# Altium footprint library TI - ADC.PcbLib: 214 footprints (part 7 of 14)
Each footprint in its own frame and in the unit in brackets; x right, y up, seen from the top. Pads: shape width x height; smd on the part's side, far side on the other; paste and mask are expansions set on the pad; w line width, h text height; cw(c..) or ccw(c..) is an arc to the next point about the centre after c.
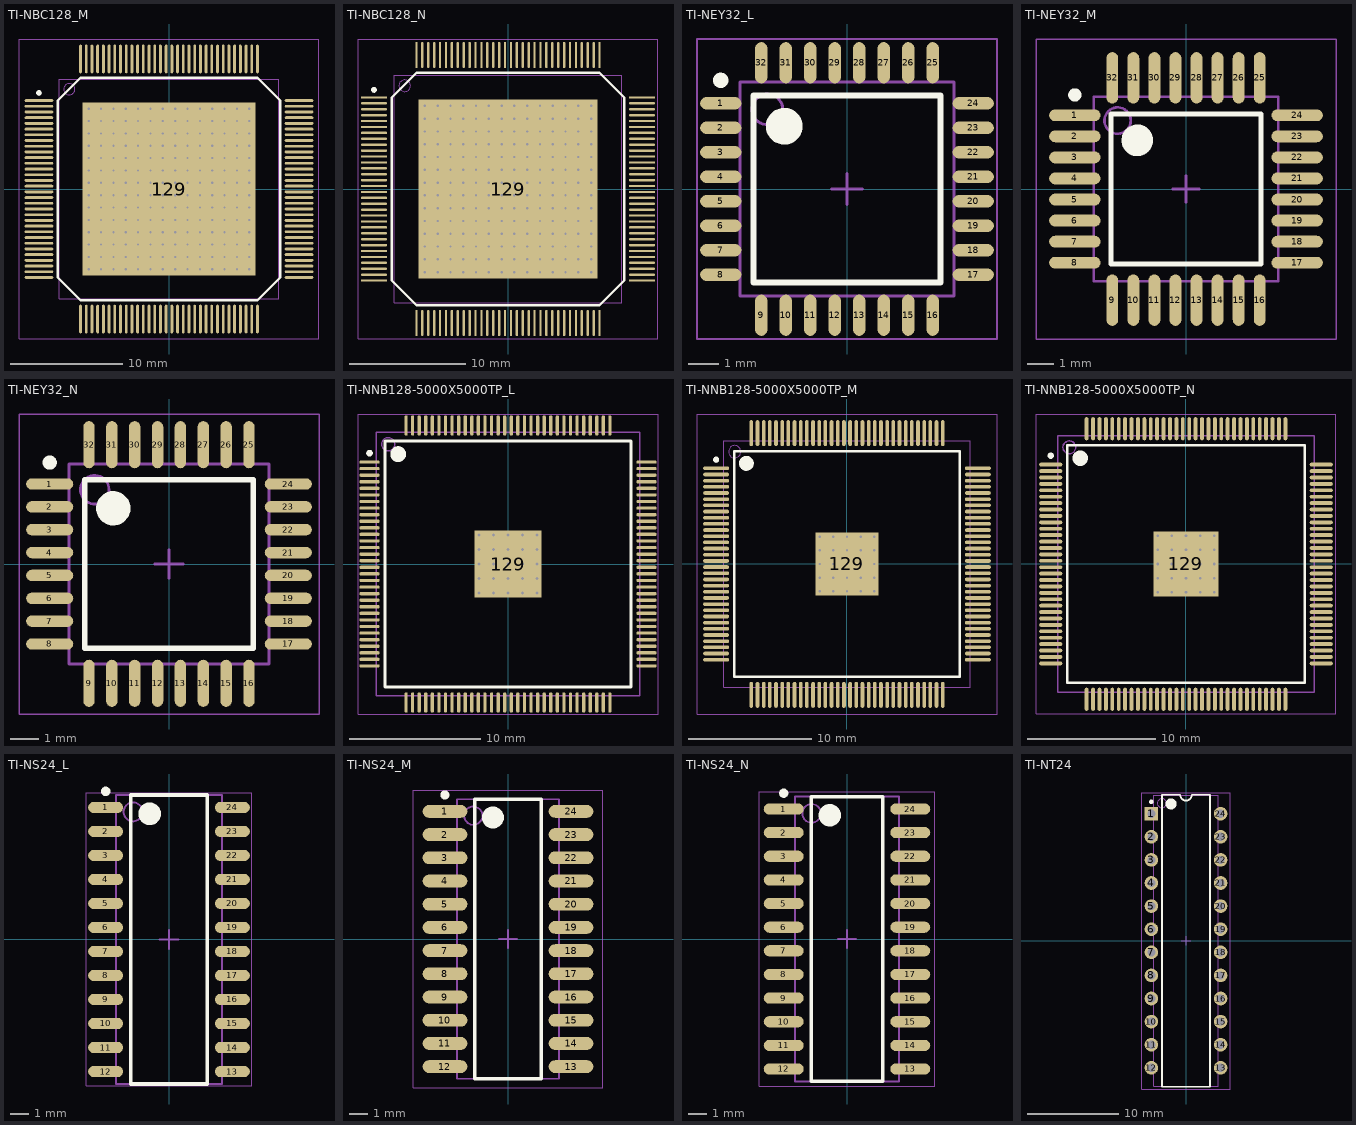
[diagram p6: the footprints below, top view; thin cyan lines are the x and y axes]

## TI-NBC128_M [mm] "CQFP, 128-Leads, Body 19.558x19.558mm, Pitch 0.508mm, Thermal Pad 15.39 x 15.39 mm, IPC Low Density"
height 1.99
pads (129):
  oval 2.55x0.25 smd: 1(-11.575,7.874) 2(-11.575,7.366) 3(-11.575,6.858) 4(-11.575,6.35) 5(-11.575,5.842) 6(-11.575,5.334) 7(-11.575,4.826) 8(-11.575,4.318) 9(-11.575,3.81) 10(-11.575,3.302) 11(-11.575,2.794) 12(-11.575,2.286) 13(-11.575,1.778) 14(-11.575,1.27) 15(-11.575,0.762) 16(-11.575,0.254) 17(-11.575,-0.254) 18(-11.575,-0.762) 19(-11.575,-1.27) 20(-11.575,-1.778) 21(-11.575,-2.286) 22(-11.575,-2.794) 23(-11.575,-3.302) 24(-11.575,-3.81) 25(-11.575,-4.318) 26(-11.575,-4.826) 27(-11.575,-5.334) 28(-11.575,-5.842) 29(-11.575,-6.35) 30(-11.575,-6.858) 31(-11.575,-7.366) 32(-11.575,-7.874) 65(11.575,-7.874) 66(11.575,-7.366) 67(11.575,-6.858) 68(11.575,-6.35) 69(11.575,-5.842) 70(11.575,-5.334) 71(11.575,-4.826) 72(11.575,-4.318) 73(11.575,-3.81) 74(11.575,-3.302) 75(11.575,-2.794) 76(11.575,-2.286) 77(11.575,-1.778) 78(11.575,-1.27) 79(11.575,-0.762) 80(11.575,-0.254) 81(11.575,0.254) 82(11.575,0.762) 83(11.575,1.27) 84(11.575,1.778) 85(11.575,2.286) 86(11.575,2.794) 87(11.575,3.302) 88(11.575,3.81) 89(11.575,4.318) 90(11.575,4.826) 91(11.575,5.334) 92(11.575,5.842) 93(11.575,6.35) 94(11.575,6.858) 95(11.575,7.366) 96(11.575,7.874)
  oval 0.25x2.55 smd: 33(-7.874,-11.575) 34(-7.366,-11.575) 35(-6.858,-11.575) 36(-6.35,-11.575) 37(-5.842,-11.575) 38(-5.334,-11.575) 39(-4.826,-11.575) 40(-4.318,-11.575) 41(-3.81,-11.575) 42(-3.302,-11.575) 43(-2.794,-11.575) 44(-2.286,-11.575) 45(-1.778,-11.575) 46(-1.27,-11.575) 47(-0.762,-11.575) 48(-0.254,-11.575) 49(0.254,-11.575) 50(0.762,-11.575) 51(1.27,-11.575) 52(1.778,-11.575) 53(2.286,-11.575) 54(2.794,-11.575) 55(3.302,-11.575) 56(3.81,-11.575) 57(4.318,-11.575) 58(4.826,-11.575) 59(5.334,-11.575) 60(5.842,-11.575) 61(6.35,-11.575) 62(6.858,-11.575) 63(7.366,-11.575) 64(7.874,-11.575) 97(7.874,11.575) 98(7.366,11.575) 99(6.858,11.575) 100(6.35,11.575) 101(5.842,11.575) 102(5.334,11.575) 103(4.826,11.575) 104(4.318,11.575) 105(3.81,11.575) 106(3.302,11.575) 107(2.794,11.575) 108(2.286,11.575) 109(1.778,11.575) 110(1.27,11.575) 111(0.762,11.575) 112(0.254,11.575) 113(-0.254,11.575) 114(-0.762,11.575) 115(-1.27,11.575) 116(-1.778,11.575) 117(-2.286,11.575) 118(-2.794,11.575) 119(-3.302,11.575) 120(-3.81,11.575) 121(-4.318,11.575) 122(-4.826,11.575) 123(-5.334,11.575) 124(-5.842,11.575) 125(-6.35,11.575) 126(-6.858,11.575) 127(-7.366,11.575) 128(-7.874,11.575)
  rect 15.39x15.39 smd: 129(0,0)
via -7.15,7.15 diameter 0.5 hole 0.2
via -6.05,7.15 diameter 0.5 hole 0.2
via -4.95,7.15 diameter 0.5 hole 0.2
via -3.85,7.15 diameter 0.5 hole 0.2
via -2.75,7.15 diameter 0.5 hole 0.2
via -1.65,7.15 diameter 0.5 hole 0.2
via -0.55,7.15 diameter 0.5 hole 0.2
via 0.55,7.15 diameter 0.5 hole 0.2
via 1.65,7.15 diameter 0.5 hole 0.2
via 2.75,7.15 diameter 0.5 hole 0.2
via 3.85,7.15 diameter 0.5 hole 0.2
via 4.95,7.15 diameter 0.5 hole 0.2
via 6.05,7.15 diameter 0.5 hole 0.2
via 7.15,7.15 diameter 0.5 hole 0.2
via -7.15,6.05 diameter 0.5 hole 0.2
via -6.05,6.05 diameter 0.5 hole 0.2
via -4.95,6.05 diameter 0.5 hole 0.2
via -3.85,6.05 diameter 0.5 hole 0.2
via -2.75,6.05 diameter 0.5 hole 0.2
via -1.65,6.05 diameter 0.5 hole 0.2
via -0.55,6.05 diameter 0.5 hole 0.2
via 0.55,6.05 diameter 0.5 hole 0.2
via 1.65,6.05 diameter 0.5 hole 0.2
via 2.75,6.05 diameter 0.5 hole 0.2
via 3.85,6.05 diameter 0.5 hole 0.2
via 4.95,6.05 diameter 0.5 hole 0.2
via 6.05,6.05 diameter 0.5 hole 0.2
via 7.15,6.05 diameter 0.5 hole 0.2
via -7.15,4.95 diameter 0.5 hole 0.2
via -6.05,4.95 diameter 0.5 hole 0.2
via -4.95,4.95 diameter 0.5 hole 0.2
via -3.85,4.95 diameter 0.5 hole 0.2
via -2.75,4.95 diameter 0.5 hole 0.2
via -1.65,4.95 diameter 0.5 hole 0.2
via -0.55,4.95 diameter 0.5 hole 0.2
via 0.55,4.95 diameter 0.5 hole 0.2
via 1.65,4.95 diameter 0.5 hole 0.2
via 2.75,4.95 diameter 0.5 hole 0.2
via 3.85,4.95 diameter 0.5 hole 0.2
via 4.95,4.95 diameter 0.5 hole 0.2
via 6.05,4.95 diameter 0.5 hole 0.2
via 7.15,4.95 diameter 0.5 hole 0.2
via -7.15,3.85 diameter 0.5 hole 0.2
via -6.05,3.85 diameter 0.5 hole 0.2
via -4.95,3.85 diameter 0.5 hole 0.2
via -3.85,3.85 diameter 0.5 hole 0.2
via -2.75,3.85 diameter 0.5 hole 0.2
via -1.65,3.85 diameter 0.5 hole 0.2
via -0.55,3.85 diameter 0.5 hole 0.2
via 0.55,3.85 diameter 0.5 hole 0.2
via 1.65,3.85 diameter 0.5 hole 0.2
via 2.75,3.85 diameter 0.5 hole 0.2
via 3.85,3.85 diameter 0.5 hole 0.2
via 4.95,3.85 diameter 0.5 hole 0.2
via 6.05,3.85 diameter 0.5 hole 0.2
via 7.15,3.85 diameter 0.5 hole 0.2
via -7.15,2.75 diameter 0.5 hole 0.2
via -6.05,2.75 diameter 0.5 hole 0.2
via -4.95,2.75 diameter 0.5 hole 0.2
via -3.85,2.75 diameter 0.5 hole 0.2
via -2.75,2.75 diameter 0.5 hole 0.2
via -1.65,2.75 diameter 0.5 hole 0.2
via -0.55,2.75 diameter 0.5 hole 0.2
via 0.55,2.75 diameter 0.5 hole 0.2
via 1.65,2.75 diameter 0.5 hole 0.2
via 2.75,2.75 diameter 0.5 hole 0.2
via 3.85,2.75 diameter 0.5 hole 0.2
via 4.95,2.75 diameter 0.5 hole 0.2
via 6.05,2.75 diameter 0.5 hole 0.2
via 7.15,2.75 diameter 0.5 hole 0.2
via -7.15,1.65 diameter 0.5 hole 0.2
via -6.05,1.65 diameter 0.5 hole 0.2
via -4.95,1.65 diameter 0.5 hole 0.2
via -3.85,1.65 diameter 0.5 hole 0.2
via -2.75,1.65 diameter 0.5 hole 0.2
via -1.65,1.65 diameter 0.5 hole 0.2
via -0.55,1.65 diameter 0.5 hole 0.2
via 0.55,1.65 diameter 0.5 hole 0.2
via 1.65,1.65 diameter 0.5 hole 0.2
via 2.75,1.65 diameter 0.5 hole 0.2
via 3.85,1.65 diameter 0.5 hole 0.2
via 4.95,1.65 diameter 0.5 hole 0.2
via 6.05,1.65 diameter 0.5 hole 0.2
via 7.15,1.65 diameter 0.5 hole 0.2
via -7.15,0.55 diameter 0.5 hole 0.2
via -6.05,0.55 diameter 0.5 hole 0.2
via -4.95,0.55 diameter 0.5 hole 0.2
via -3.85,0.55 diameter 0.5 hole 0.2
via -2.75,0.55 diameter 0.5 hole 0.2
via -1.65,0.55 diameter 0.5 hole 0.2
via -0.55,0.55 diameter 0.5 hole 0.2
via 0.55,0.55 diameter 0.5 hole 0.2
via 1.65,0.55 diameter 0.5 hole 0.2
via 2.75,0.55 diameter 0.5 hole 0.2
via 3.85,0.55 diameter 0.5 hole 0.2
via 4.95,0.55 diameter 0.5 hole 0.2
via 6.05,0.55 diameter 0.5 hole 0.2
via 7.15,0.55 diameter 0.5 hole 0.2
via -7.15,-0.55 diameter 0.5 hole 0.2
via -6.05,-0.55 diameter 0.5 hole 0.2
via -4.95,-0.55 diameter 0.5 hole 0.2
via -3.85,-0.55 diameter 0.5 hole 0.2
via -2.75,-0.55 diameter 0.5 hole 0.2
via -1.65,-0.55 diameter 0.5 hole 0.2
via -0.55,-0.55 diameter 0.5 hole 0.2
via 0.55,-0.55 diameter 0.5 hole 0.2
via 1.65,-0.55 diameter 0.5 hole 0.2
via 2.75,-0.55 diameter 0.5 hole 0.2
via 3.85,-0.55 diameter 0.5 hole 0.2
via 4.95,-0.55 diameter 0.5 hole 0.2
via 6.05,-0.55 diameter 0.5 hole 0.2
via 7.15,-0.55 diameter 0.5 hole 0.2
via -7.15,-1.65 diameter 0.5 hole 0.2
via -6.05,-1.65 diameter 0.5 hole 0.2
via -4.95,-1.65 diameter 0.5 hole 0.2
via -3.85,-1.65 diameter 0.5 hole 0.2
via -2.75,-1.65 diameter 0.5 hole 0.2
via -1.65,-1.65 diameter 0.5 hole 0.2
via -0.55,-1.65 diameter 0.5 hole 0.2
via 0.55,-1.65 diameter 0.5 hole 0.2
via 1.65,-1.65 diameter 0.5 hole 0.2
via 2.75,-1.65 diameter 0.5 hole 0.2
via 3.85,-1.65 diameter 0.5 hole 0.2
via 4.95,-1.65 diameter 0.5 hole 0.2
via 6.05,-1.65 diameter 0.5 hole 0.2
via 7.15,-1.65 diameter 0.5 hole 0.2
via -7.15,-2.75 diameter 0.5 hole 0.2
via -6.05,-2.75 diameter 0.5 hole 0.2
via -4.95,-2.75 diameter 0.5 hole 0.2
via -3.85,-2.75 diameter 0.5 hole 0.2
via -2.75,-2.75 diameter 0.5 hole 0.2
via -1.65,-2.75 diameter 0.5 hole 0.2
via -0.55,-2.75 diameter 0.5 hole 0.2
via 0.55,-2.75 diameter 0.5 hole 0.2
via 1.65,-2.75 diameter 0.5 hole 0.2
via 2.75,-2.75 diameter 0.5 hole 0.2
via 3.85,-2.75 diameter 0.5 hole 0.2
via 4.95,-2.75 diameter 0.5 hole 0.2
via 6.05,-2.75 diameter 0.5 hole 0.2
via 7.15,-2.75 diameter 0.5 hole 0.2
via -7.15,-3.85 diameter 0.5 hole 0.2
via -6.05,-3.85 diameter 0.5 hole 0.2
via -4.95,-3.85 diameter 0.5 hole 0.2
via -3.85,-3.85 diameter 0.5 hole 0.2
via -2.75,-3.85 diameter 0.5 hole 0.2
via -1.65,-3.85 diameter 0.5 hole 0.2
via -0.55,-3.85 diameter 0.5 hole 0.2
via 0.55,-3.85 diameter 0.5 hole 0.2
via 1.65,-3.85 diameter 0.5 hole 0.2
via 2.75,-3.85 diameter 0.5 hole 0.2
via 3.85,-3.85 diameter 0.5 hole 0.2
via 4.95,-3.85 diameter 0.5 hole 0.2
via 6.05,-3.85 diameter 0.5 hole 0.2
via 7.15,-3.85 diameter 0.5 hole 0.2
via -7.15,-4.95 diameter 0.5 hole 0.2
via -6.05,-4.95 diameter 0.5 hole 0.2
via -4.95,-4.95 diameter 0.5 hole 0.2
via -3.85,-4.95 diameter 0.5 hole 0.2
via -2.75,-4.95 diameter 0.5 hole 0.2
via -1.65,-4.95 diameter 0.5 hole 0.2
via -0.55,-4.95 diameter 0.5 hole 0.2
via 0.55,-4.95 diameter 0.5 hole 0.2
via 1.65,-4.95 diameter 0.5 hole 0.2
via 2.75,-4.95 diameter 0.5 hole 0.2
via 3.85,-4.95 diameter 0.5 hole 0.2
via 4.95,-4.95 diameter 0.5 hole 0.2
via 6.05,-4.95 diameter 0.5 hole 0.2
via 7.15,-4.95 diameter 0.5 hole 0.2
via -7.15,-6.05 diameter 0.5 hole 0.2
via -6.05,-6.05 diameter 0.5 hole 0.2
via -4.95,-6.05 diameter 0.5 hole 0.2
via -3.85,-6.05 diameter 0.5 hole 0.2
via -2.75,-6.05 diameter 0.5 hole 0.2
via -1.65,-6.05 diameter 0.5 hole 0.2
via -0.55,-6.05 diameter 0.5 hole 0.2
via 0.55,-6.05 diameter 0.5 hole 0.2
via 1.65,-6.05 diameter 0.5 hole 0.2
via 2.75,-6.05 diameter 0.5 hole 0.2
via 3.85,-6.05 diameter 0.5 hole 0.2
via 4.95,-6.05 diameter 0.5 hole 0.2
via 6.05,-6.05 diameter 0.5 hole 0.2
via 7.15,-6.05 diameter 0.5 hole 0.2
via -7.15,-7.15 diameter 0.5 hole 0.2
via -6.05,-7.15 diameter 0.5 hole 0.2
via -4.95,-7.15 diameter 0.5 hole 0.2
via -3.85,-7.15 diameter 0.5 hole 0.2
via -2.75,-7.15 diameter 0.5 hole 0.2
via -1.65,-7.15 diameter 0.5 hole 0.2
via -0.55,-7.15 diameter 0.5 hole 0.2
via 0.55,-7.15 diameter 0.5 hole 0.2
via 1.65,-7.15 diameter 0.5 hole 0.2
via 2.75,-7.15 diameter 0.5 hole 0.2
via 3.85,-7.15 diameter 0.5 hole 0.2
via 4.95,-7.15 diameter 0.5 hole 0.2
via 6.05,-7.15 diameter 0.5 hole 0.2
via 7.15,-7.15 diameter 0.5 hole 0.2
Top Overlay:
  circle w0.25: c-11.575,8.549 r0.125
  lines w0.2: -9.9,-7.875 -9.9,7.875 -7.875,9.9 7.875,9.9 9.9,7.875 9.9,-7.875 7.875,-9.9 -7.875,-9.9 -9.9,-7.875
Mechanical 13:
  circle w0.1: c-8.88,8.88 r0.5
  lines w0.1: -9.78,-9.78 -9.78,9.78 9.78,9.78 9.78,-9.78 -9.78,-9.78
Mechanical 15:
  lines w0.05: -13.35,-13.35 -13.35,13.35 13.35,13.35 13.35,-13.35 -13.35,-13.35
  lines w0.1: -0.5,0 0.5,0 ; 0,-0.5 0,0.5
3D body: height 1.99, standoff 0, extent -9.78,-9.78 9.78,9.78

## TI-NBC128_N [mm] "CQFP, 128-Leads, Body 19.558x19.558mm, Pitch 0.508mm, Thermal Pad 15.39 x 15.39 mm, IPC Medium Density"
height 1.99
pads (129):
  oval 2.25x0.2 smd: 1(-11.525,7.874) 2(-11.525,7.366) 3(-11.525,6.858) 4(-11.525,6.35) 5(-11.525,5.842) 6(-11.525,5.334) 7(-11.525,4.826) 8(-11.525,4.318) 9(-11.525,3.81) 10(-11.525,3.302) 11(-11.525,2.794) 12(-11.525,2.286) 13(-11.525,1.778) 14(-11.525,1.27) 15(-11.525,0.762) 16(-11.525,0.254) 17(-11.525,-0.254) 18(-11.525,-0.762) 19(-11.525,-1.27) 20(-11.525,-1.778) 21(-11.525,-2.286) 22(-11.525,-2.794) 23(-11.525,-3.302) 24(-11.525,-3.81) 25(-11.525,-4.318) 26(-11.525,-4.826) 27(-11.525,-5.334) 28(-11.525,-5.842) 29(-11.525,-6.35) 30(-11.525,-6.858) 31(-11.525,-7.366) 32(-11.525,-7.874) 65(11.525,-7.874) 66(11.525,-7.366) 67(11.525,-6.858) 68(11.525,-6.35) 69(11.525,-5.842) 70(11.525,-5.334) 71(11.525,-4.826) 72(11.525,-4.318) 73(11.525,-3.81) 74(11.525,-3.302) 75(11.525,-2.794) 76(11.525,-2.286) 77(11.525,-1.778) 78(11.525,-1.27) 79(11.525,-0.762) 80(11.525,-0.254) 81(11.525,0.254) 82(11.525,0.762) 83(11.525,1.27) 84(11.525,1.778) 85(11.525,2.286) 86(11.525,2.794) 87(11.525,3.302) 88(11.525,3.81) 89(11.525,4.318) 90(11.525,4.826) 91(11.525,5.334) 92(11.525,5.842) 93(11.525,6.35) 94(11.525,6.858) 95(11.525,7.366) 96(11.525,7.874)
  oval 0.2x2.25 smd: 33(-7.874,-11.525) 34(-7.366,-11.525) 35(-6.858,-11.525) 36(-6.35,-11.525) 37(-5.842,-11.525) 38(-5.334,-11.525) 39(-4.826,-11.525) 40(-4.318,-11.525) 41(-3.81,-11.525) 42(-3.302,-11.525) 43(-2.794,-11.525) 44(-2.286,-11.525) 45(-1.778,-11.525) 46(-1.27,-11.525) 47(-0.762,-11.525) 48(-0.254,-11.525) 49(0.254,-11.525) 50(0.762,-11.525) 51(1.27,-11.525) 52(1.778,-11.525) 53(2.286,-11.525) 54(2.794,-11.525) 55(3.302,-11.525) 56(3.81,-11.525) 57(4.318,-11.525) 58(4.826,-11.525) 59(5.334,-11.525) 60(5.842,-11.525) 61(6.35,-11.525) 62(6.858,-11.525) 63(7.366,-11.525) 64(7.874,-11.525) 97(7.874,11.525) 98(7.366,11.525) 99(6.858,11.525) 100(6.35,11.525) 101(5.842,11.525) 102(5.334,11.525) 103(4.826,11.525) 104(4.318,11.525) 105(3.81,11.525) 106(3.302,11.525) 107(2.794,11.525) 108(2.286,11.525) 109(1.778,11.525) 110(1.27,11.525) 111(0.762,11.525) 112(0.254,11.525) 113(-0.254,11.525) 114(-0.762,11.525) 115(-1.27,11.525) 116(-1.778,11.525) 117(-2.286,11.525) 118(-2.794,11.525) 119(-3.302,11.525) 120(-3.81,11.525) 121(-4.318,11.525) 122(-4.826,11.525) 123(-5.334,11.525) 124(-5.842,11.525) 125(-6.35,11.525) 126(-6.858,11.525) 127(-7.366,11.525) 128(-7.874,11.525)
  rect 15.39x15.39 smd: 129(0,0)
via -7.15,7.15 diameter 0.5 hole 0.2
via -6.05,7.15 diameter 0.5 hole 0.2
via -4.95,7.15 diameter 0.5 hole 0.2
via -3.85,7.15 diameter 0.5 hole 0.2
via -2.75,7.15 diameter 0.5 hole 0.2
via -1.65,7.15 diameter 0.5 hole 0.2
via -0.55,7.15 diameter 0.5 hole 0.2
via 0.55,7.15 diameter 0.5 hole 0.2
via 1.65,7.15 diameter 0.5 hole 0.2
via 2.75,7.15 diameter 0.5 hole 0.2
via 3.85,7.15 diameter 0.5 hole 0.2
via 4.95,7.15 diameter 0.5 hole 0.2
via 6.05,7.15 diameter 0.5 hole 0.2
via 7.15,7.15 diameter 0.5 hole 0.2
via -7.15,6.05 diameter 0.5 hole 0.2
via -6.05,6.05 diameter 0.5 hole 0.2
via -4.95,6.05 diameter 0.5 hole 0.2
via -3.85,6.05 diameter 0.5 hole 0.2
via -2.75,6.05 diameter 0.5 hole 0.2
via -1.65,6.05 diameter 0.5 hole 0.2
via -0.55,6.05 diameter 0.5 hole 0.2
via 0.55,6.05 diameter 0.5 hole 0.2
via 1.65,6.05 diameter 0.5 hole 0.2
via 2.75,6.05 diameter 0.5 hole 0.2
via 3.85,6.05 diameter 0.5 hole 0.2
via 4.95,6.05 diameter 0.5 hole 0.2
via 6.05,6.05 diameter 0.5 hole 0.2
via 7.15,6.05 diameter 0.5 hole 0.2
via -7.15,4.95 diameter 0.5 hole 0.2
via -6.05,4.95 diameter 0.5 hole 0.2
via -4.95,4.95 diameter 0.5 hole 0.2
via -3.85,4.95 diameter 0.5 hole 0.2
via -2.75,4.95 diameter 0.5 hole 0.2
via -1.65,4.95 diameter 0.5 hole 0.2
via -0.55,4.95 diameter 0.5 hole 0.2
via 0.55,4.95 diameter 0.5 hole 0.2
via 1.65,4.95 diameter 0.5 hole 0.2
via 2.75,4.95 diameter 0.5 hole 0.2
via 3.85,4.95 diameter 0.5 hole 0.2
via 4.95,4.95 diameter 0.5 hole 0.2
via 6.05,4.95 diameter 0.5 hole 0.2
via 7.15,4.95 diameter 0.5 hole 0.2
via -7.15,3.85 diameter 0.5 hole 0.2
via -6.05,3.85 diameter 0.5 hole 0.2
via -4.95,3.85 diameter 0.5 hole 0.2
via -3.85,3.85 diameter 0.5 hole 0.2
via -2.75,3.85 diameter 0.5 hole 0.2
via -1.65,3.85 diameter 0.5 hole 0.2
via -0.55,3.85 diameter 0.5 hole 0.2
via 0.55,3.85 diameter 0.5 hole 0.2
via 1.65,3.85 diameter 0.5 hole 0.2
via 2.75,3.85 diameter 0.5 hole 0.2
via 3.85,3.85 diameter 0.5 hole 0.2
via 4.95,3.85 diameter 0.5 hole 0.2
via 6.05,3.85 diameter 0.5 hole 0.2
via 7.15,3.85 diameter 0.5 hole 0.2
via -7.15,2.75 diameter 0.5 hole 0.2
via -6.05,2.75 diameter 0.5 hole 0.2
via -4.95,2.75 diameter 0.5 hole 0.2
via -3.85,2.75 diameter 0.5 hole 0.2
via -2.75,2.75 diameter 0.5 hole 0.2
via -1.65,2.75 diameter 0.5 hole 0.2
via -0.55,2.75 diameter 0.5 hole 0.2
via 0.55,2.75 diameter 0.5 hole 0.2
via 1.65,2.75 diameter 0.5 hole 0.2
via 2.75,2.75 diameter 0.5 hole 0.2
via 3.85,2.75 diameter 0.5 hole 0.2
via 4.95,2.75 diameter 0.5 hole 0.2
via 6.05,2.75 diameter 0.5 hole 0.2
via 7.15,2.75 diameter 0.5 hole 0.2
via -7.15,1.65 diameter 0.5 hole 0.2
via -6.05,1.65 diameter 0.5 hole 0.2
via -4.95,1.65 diameter 0.5 hole 0.2
via -3.85,1.65 diameter 0.5 hole 0.2
via -2.75,1.65 diameter 0.5 hole 0.2
via -1.65,1.65 diameter 0.5 hole 0.2
via -0.55,1.65 diameter 0.5 hole 0.2
via 0.55,1.65 diameter 0.5 hole 0.2
via 1.65,1.65 diameter 0.5 hole 0.2
via 2.75,1.65 diameter 0.5 hole 0.2
via 3.85,1.65 diameter 0.5 hole 0.2
via 4.95,1.65 diameter 0.5 hole 0.2
via 6.05,1.65 diameter 0.5 hole 0.2
via 7.15,1.65 diameter 0.5 hole 0.2
via -7.15,0.55 diameter 0.5 hole 0.2
via -6.05,0.55 diameter 0.5 hole 0.2
via -4.95,0.55 diameter 0.5 hole 0.2
via -3.85,0.55 diameter 0.5 hole 0.2
via -2.75,0.55 diameter 0.5 hole 0.2
via -1.65,0.55 diameter 0.5 hole 0.2
via -0.55,0.55 diameter 0.5 hole 0.2
via 0.55,0.55 diameter 0.5 hole 0.2
via 1.65,0.55 diameter 0.5 hole 0.2
via 2.75,0.55 diameter 0.5 hole 0.2
via 3.85,0.55 diameter 0.5 hole 0.2
via 4.95,0.55 diameter 0.5 hole 0.2
via 6.05,0.55 diameter 0.5 hole 0.2
via 7.15,0.55 diameter 0.5 hole 0.2
via -7.15,-0.55 diameter 0.5 hole 0.2
via -6.05,-0.55 diameter 0.5 hole 0.2
via -4.95,-0.55 diameter 0.5 hole 0.2
via -3.85,-0.55 diameter 0.5 hole 0.2
via -2.75,-0.55 diameter 0.5 hole 0.2
via -1.65,-0.55 diameter 0.5 hole 0.2
via -0.55,-0.55 diameter 0.5 hole 0.2
via 0.55,-0.55 diameter 0.5 hole 0.2
via 1.65,-0.55 diameter 0.5 hole 0.2
via 2.75,-0.55 diameter 0.5 hole 0.2
via 3.85,-0.55 diameter 0.5 hole 0.2
via 4.95,-0.55 diameter 0.5 hole 0.2
via 6.05,-0.55 diameter 0.5 hole 0.2
via 7.15,-0.55 diameter 0.5 hole 0.2
via -7.15,-1.65 diameter 0.5 hole 0.2
via -6.05,-1.65 diameter 0.5 hole 0.2
via -4.95,-1.65 diameter 0.5 hole 0.2
via -3.85,-1.65 diameter 0.5 hole 0.2
via -2.75,-1.65 diameter 0.5 hole 0.2
via -1.65,-1.65 diameter 0.5 hole 0.2
via -0.55,-1.65 diameter 0.5 hole 0.2
via 0.55,-1.65 diameter 0.5 hole 0.2
via 1.65,-1.65 diameter 0.5 hole 0.2
via 2.75,-1.65 diameter 0.5 hole 0.2
via 3.85,-1.65 diameter 0.5 hole 0.2
via 4.95,-1.65 diameter 0.5 hole 0.2
via 6.05,-1.65 diameter 0.5 hole 0.2
via 7.15,-1.65 diameter 0.5 hole 0.2
via -7.15,-2.75 diameter 0.5 hole 0.2
via -6.05,-2.75 diameter 0.5 hole 0.2
via -4.95,-2.75 diameter 0.5 hole 0.2
via -3.85,-2.75 diameter 0.5 hole 0.2
via -2.75,-2.75 diameter 0.5 hole 0.2
via -1.65,-2.75 diameter 0.5 hole 0.2
via -0.55,-2.75 diameter 0.5 hole 0.2
via 0.55,-2.75 diameter 0.5 hole 0.2
via 1.65,-2.75 diameter 0.5 hole 0.2
via 2.75,-2.75 diameter 0.5 hole 0.2
via 3.85,-2.75 diameter 0.5 hole 0.2
via 4.95,-2.75 diameter 0.5 hole 0.2
via 6.05,-2.75 diameter 0.5 hole 0.2
via 7.15,-2.75 diameter 0.5 hole 0.2
via -7.15,-3.85 diameter 0.5 hole 0.2
via -6.05,-3.85 diameter 0.5 hole 0.2
via -4.95,-3.85 diameter 0.5 hole 0.2
via -3.85,-3.85 diameter 0.5 hole 0.2
via -2.75,-3.85 diameter 0.5 hole 0.2
via -1.65,-3.85 diameter 0.5 hole 0.2
via -0.55,-3.85 diameter 0.5 hole 0.2
via 0.55,-3.85 diameter 0.5 hole 0.2
via 1.65,-3.85 diameter 0.5 hole 0.2
via 2.75,-3.85 diameter 0.5 hole 0.2
via 3.85,-3.85 diameter 0.5 hole 0.2
via 4.95,-3.85 diameter 0.5 hole 0.2
via 6.05,-3.85 diameter 0.5 hole 0.2
via 7.15,-3.85 diameter 0.5 hole 0.2
via -7.15,-4.95 diameter 0.5 hole 0.2
via -6.05,-4.95 diameter 0.5 hole 0.2
via -4.95,-4.95 diameter 0.5 hole 0.2
via -3.85,-4.95 diameter 0.5 hole 0.2
via -2.75,-4.95 diameter 0.5 hole 0.2
via -1.65,-4.95 diameter 0.5 hole 0.2
via -0.55,-4.95 diameter 0.5 hole 0.2
via 0.55,-4.95 diameter 0.5 hole 0.2
via 1.65,-4.95 diameter 0.5 hole 0.2
via 2.75,-4.95 diameter 0.5 hole 0.2
via 3.85,-4.95 diameter 0.5 hole 0.2
via 4.95,-4.95 diameter 0.5 hole 0.2
via 6.05,-4.95 diameter 0.5 hole 0.2
via 7.15,-4.95 diameter 0.5 hole 0.2
via -7.15,-6.05 diameter 0.5 hole 0.2
via -6.05,-6.05 diameter 0.5 hole 0.2
via -4.95,-6.05 diameter 0.5 hole 0.2
via -3.85,-6.05 diameter 0.5 hole 0.2
via -2.75,-6.05 diameter 0.5 hole 0.2
via -1.65,-6.05 diameter 0.5 hole 0.2
via -0.55,-6.05 diameter 0.5 hole 0.2
via 0.55,-6.05 diameter 0.5 hole 0.2
via 1.65,-6.05 diameter 0.5 hole 0.2
via 2.75,-6.05 diameter 0.5 hole 0.2
via 3.85,-6.05 diameter 0.5 hole 0.2
via 4.95,-6.05 diameter 0.5 hole 0.2
via 6.05,-6.05 diameter 0.5 hole 0.2
via 7.15,-6.05 diameter 0.5 hole 0.2
via -7.15,-7.15 diameter 0.5 hole 0.2
via -6.05,-7.15 diameter 0.5 hole 0.2
via -4.95,-7.15 diameter 0.5 hole 0.2
via -3.85,-7.15 diameter 0.5 hole 0.2
via -2.75,-7.15 diameter 0.5 hole 0.2
via -1.65,-7.15 diameter 0.5 hole 0.2
via -0.55,-7.15 diameter 0.5 hole 0.2
via 0.55,-7.15 diameter 0.5 hole 0.2